# Altium footprint library Elettronica FM.PcbLib: 387 footprints (part 13 of 25)
Each footprint in its own frame and in the unit in brackets; x right, y up, seen from the top. Pads: shape width x height; smd on the part's side, far side on the other; paste and mask are expansions set on the pad; w line width, h text height; cw(c..) or ccw(c..) is an arc to the next point about the centre after c.
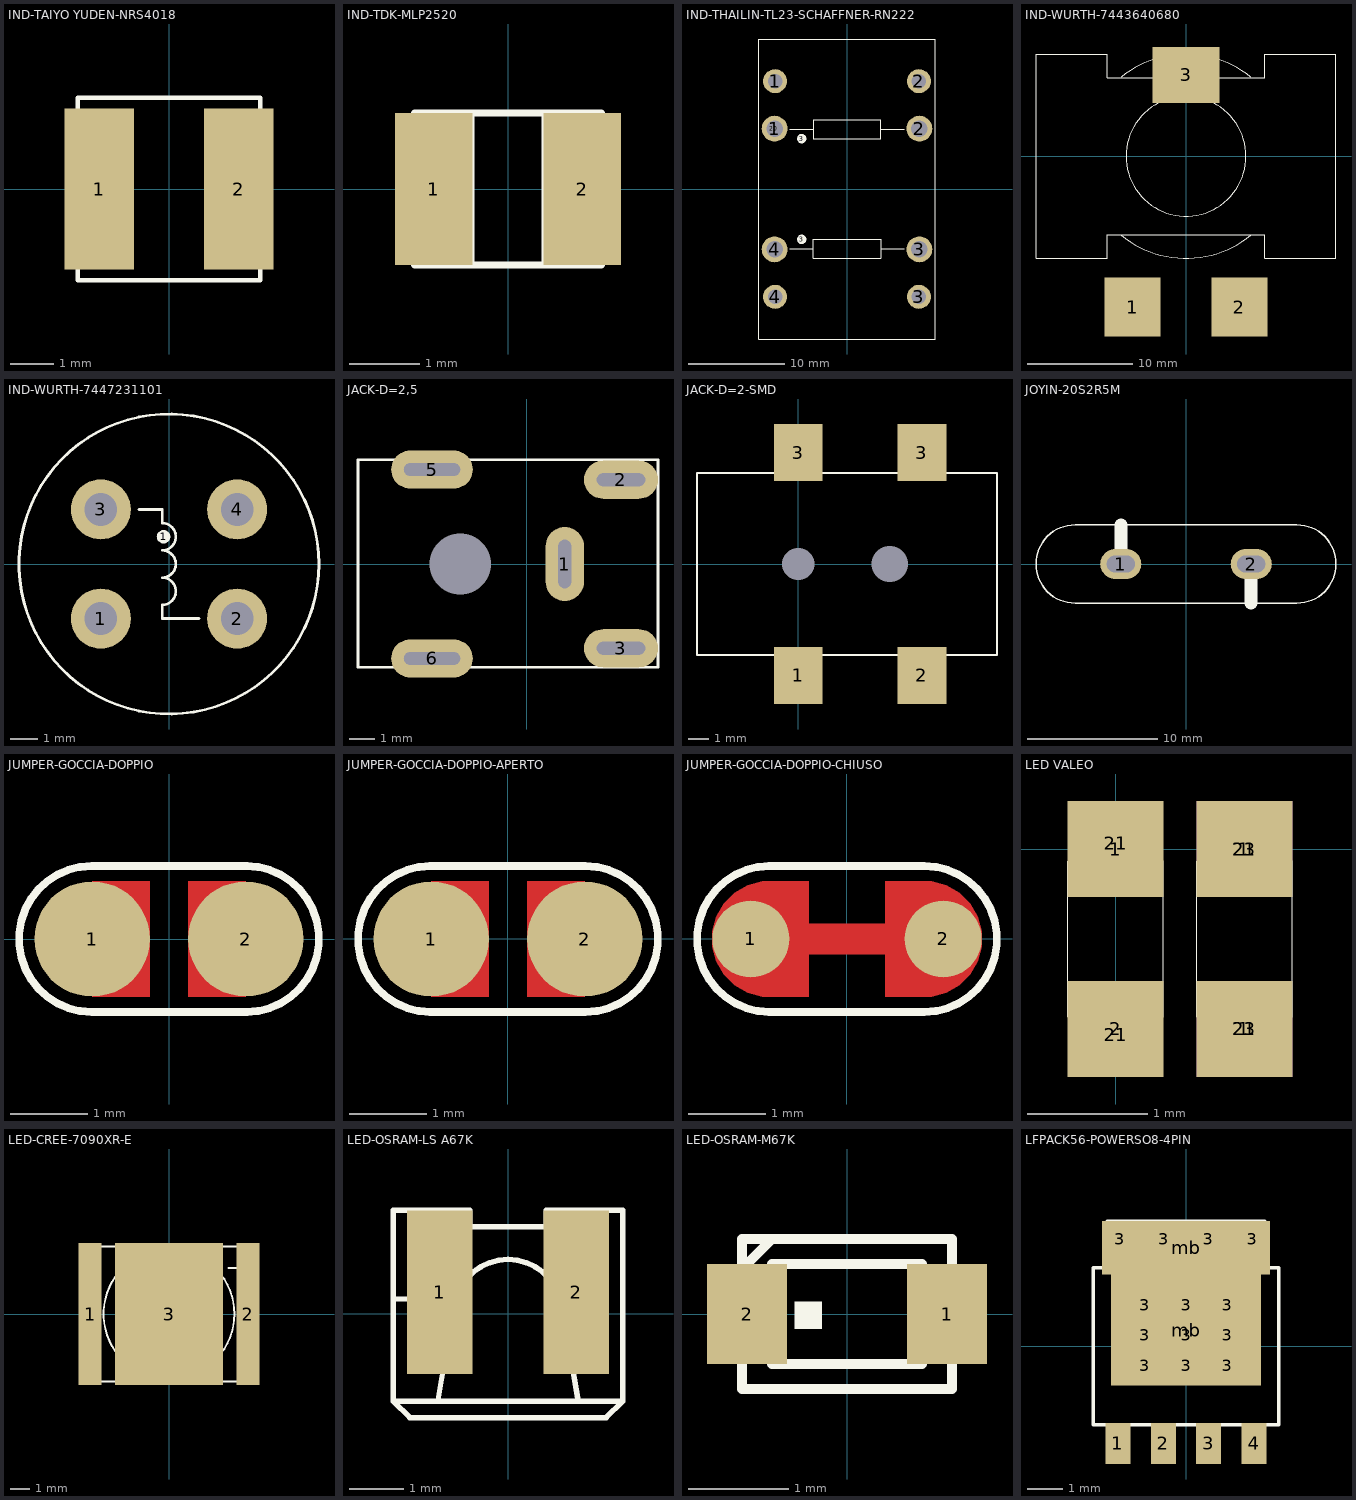
[diagram p12: the footprints below, top view; thin cyan lines are the x and y axes]

## IND-TAIYO YUDEN-NRS4018 [mm]
height 1.9
pads (2):
  rect 1.6x3.7 smd mask+0.075: 1(-1.6,0) 2(1.6,0)
Top Overlay:
  lines w0.1: -2.1,-2.1 -2.1,2.1 2.1,2.1 2.1,-2.1 -2.1,-2.1
3D body: height 1.8, standoff 0, extent -2.1,-2.1 2.1,2.1

## IND-TDK-MLP2520 [mm]
height 12
pads (2):
  rect 1.1x2.15 smd mask+0.1: 1(-1.05,0) 2(1.05,0)
Top Overlay:
  lines w0.1: -0.525,-1.075 -0.525,1.075 ; 0.525,-1.075 0.525,1.075 ; -1.325,-1.075 1.325,-1.075 1.325,1.075 -1.325,1.075 -1.325,-1.075
3D body: height 1.2, standoff 0, extent -1.325,-1.075 1.325,1.075

## IND-THAILIN-TL23-SCHAFFNER-RN222 [mm]
pads (11):
  round 2.7 hole 1.7: 1(-7.55,6.3) 2(7.55,6.3) 3(7.55,-6.3) 4(-7.55,-6.3)
  round 2.5 hole 1.5: 1(-7.5,11.25) 2(7.5,11.25) 3(7.5,-11.25) 4(-7.5,-11.25)
  round 1 on Top Overlay mask+0.1: 3(-4.725,-5.25) 3(-4.725,5.25) 20(-7.62,6.3)
Top Overlay:
  lines w0.1: -5.95,-6.25 -3.5,-6.25 ; -5.95,6.25 -3.5,6.25 ; 3.5,-6.25 5.95,-6.25 ; 3.5,6.25 5.95,6.25 ; -9.2,-15.65 -9.2,15.65 9.2,15.65 9.2,-15.65 -9.2,-15.65 ; -3.5,-7.25 -3.5,-5.25 3.5,-5.25 3.5,-7.25 -3.5,-7.25 ; -3.5,5.25 3.5,5.25 3.5,7.25 -3.5,7.25 -3.5,5.25
3D body: height 29.6, standoff 0, extent -9.2,-15.65 9.2,15.65

## IND-WURTH-7443640680 [mm]
height 1.9
pads (3):
  rect 5.35x5.6 smd: 1(-5.075,-14.325) 2(5.075,-14.325)
  rect 6.35x5.3 smd: 3(0,7.725)
Top Overlay:
  circle w0.1: c0,0 r5.7
  lines w0.1: -6.171,-7.484 ccw(c0,0) 6.171,-7.484 ; -6.171,7.484 cw(c0,0) 6.171,7.484 ; -14.25,-9.7 -14.25,9.7 -7.5,9.7 -7.5,7.475 7.5,7.475 7.5,9.7 14.25,9.7 14.25,-9.7 7.5,-9.7 7.5,-7.475 -7.5,-7.475 -7.5,-9.7 -14.25,-9.7
3D body "STEP-WE-HCF-2818-rev1.stp": height 18.5, standoff 0, extent -14.25,-16.65 14.25,11.35

## IND-WURTH-7447231101 [mm]
pads (5):
  round 2.2 hole 1.2 paste+0 mask+0.05: 1(-2.5,-2) 2(2.5,-2) 3(-2.5,2) 4(2.5,2)
  round 0.5 on Top Overlay paste+0 mask+0.05: 1(-0.2,1)
Top Overlay:
  circle w0.1: c0,0 r5.5
  lines w0.1: -1.1,2 -0.25,2 -0.25,1.5 cw(c-0.25,1) -0.25,0.5 cw(c-0.25,0) -0.25,-0.5 cw(c-0.25,-1) -0.25,-1.5 -0.25,-2 1.1,-2
3D body: height 19, standoff 0, extent -5.5,-5.5 5.5,5.5

## JACK-D=2,5 [mm]
pads (6):
  round 0 hole 2.4 unplated mask+0.1: 1(-2.6,0)
  oval 1.5x2.9 hole 0.5 slot 1.9 at 90 deg mask+0.1: 1(1.5,0)
  oval 2.9x1.5 hole 0.5 slot 1.9 at 0 deg mask+0.1: 2(3.7,3.3) 3(3.7,-3.3)
  oval 3.2x1.5 hole 0.5 slot 2.2 at 0 deg mask+0.1: 5(-3.7,3.7) 6(-3.7,-3.7)
Top Overlay:
  lines w0.1: -6.6,-4.05 -6.6,4.075 5.15,4.075 5.15,-4.05 -6.6,-4.05
3D body "PJ-047BH.stp": height 9.8, standoff -2.7, extent -6.6,-3.85 5.15,3.85

## JACK-D=2-SMD [mm]
pads (6):
  rect 2.4x2.8 smd mask+0.1: 1(0,-5.5) 2(6.1,-5.5) 3(0,5.5) 3(6.1,5.5)
  round 0 hole 1.6 unplated mask+0.1: 1(0,0)
  round 0 hole 1.8 unplated mask+0.1: 1(4.5,0)
Top Overlay:
  lines w0.1: -5,-4.5 -5,4.5 9.8,4.5 9.8,-4.5 -5,-4.5
3D body "PJ-002AH-SMT.stp": height 11, standoff -1.2, extent -5,-6.3 9.8,6.3

## JOYIN-20S2R5M [mm]
pads (2):
  oval 3.15x2.3 hole 1.3 slot 2.15 at 0 deg: 1(-5,0) 2(5,0)
Top Overlay:
  lines w0.1: -8.5,-3 cw(c-8.5,0) -8.5,3 8.5,3 cw(c8.5,0) 8.5,-3 -8.5,-3
  lines w1: -5,0 -5,3 ; 5,-3 5,0
3D body: height 2, standoff 0, extent 4.45,-2.499 5.545,-1.401
3D body: height 7, standoff 2, extent 3.95,-2.998 6.041,-0.902
3D body: height 1.1, standoff 0, extent 4.447,-2.499 5.543,0.501
3D body: height 0, standoff -4, extent 4.45,-0.599 5.545,0.499
3D body: height 0, standoff -4, extent -5.545,-0.499 -4.45,0.599
3D body: height 1.1, standoff 0, extent -5.543,-0.501 -4.447,2.499
3D body: height 7, standoff 2, extent -6.041,0.902 -3.95,2.998
3D body: height 2, standoff 0, extent -5.545,1.401 -4.45,2.499
3D body: height 28, standoff 5, extent -11.5,-3 11.5,3

## JUMPER-GOCCIA-DOPPIO [mm]
pads (2):
  round 1.5 smd paste-0.762: 1(-1,0) 2(1,0)
Top Layer:
  region: 1,0.75 0.25,0.75 0.25,-0.75 1,-0.75
  region: 1,0.75 0.25,0.75 0.25,-0.75 1,-0.75
  region: -1,0.75 -0.25,0.75 -0.25,-0.75 -1,-0.75
Top Overlay:
  lines w0.1: 1,-0.95 ccw(c1,0) 1,0.95 ; 1.016,-0.95 -1,-0.95 cw(c-1,0) -1,0.95 1.016,0.95
Top Solder:
  region: 1,0.85 0.15,0.85 0.15,-0.85 1,-0.85
  region: -1,0.85 -0.15,0.85 -0.15,-0.85 -1,-0.85

## JUMPER-GOCCIA-DOPPIO-APERTO [mm]
height 1.9
pads (2):
  round 1.5 smd paste-0.762: 1(-1,0) 2(1,0)
Top Layer:
  region: -1,-0.75 -0.25,-0.75 -0.25,0.75 -1,0.75
  region: -1,-0.75 -0.25,-0.75 -0.25,0.75 -1,0.75
  region: 1,-0.75 0.25,-0.75 0.25,0.75 1,0.75
Top Overlay:
  lines w0.1: -1.016,-0.95 1,-0.95 ccw(c1,0) 1,0.95 -1.016,0.95 ; -1,-0.95 cw(c-1,0) -1,0.95
Top Solder:
  region: -1,-0.85 -0.15,-0.85 -0.15,0.85 -1,0.85
  region: 1,-0.85 0.15,-0.85 0.15,0.85 1,0.85

## JUMPER-GOCCIA-DOPPIO-CHIUSO [mm]
height 1.9
pads (2):
  round 1 smd paste-0.762: 1(-1.25,0) 2(1.25,0)
Top Layer:
  region: -0.8,0.2 -0.8,-0.2 0.8,-0.2 0.8,0.2
  region: -0.5,0.75 -1,0.75 -1.099,0.75 -1.289,0.699 -1.461,0.6 -1.6,0.461 -1.699,0.289 -1.75,0.099 -1.75,-0.099 -1.699,-0.289 -1.6,-0.461 -1.461,-0.6 -1.289,-0.699 -1.099,-0.75 -1,-0.75 -0.5,-0.75
  region: 0.5,0.75 1,0.75 1.099,0.75 1.289,0.699 1.461,0.6 1.6,0.461 1.699,0.289 1.75,0.099 1.75,-0.099 1.699,-0.289 1.6,-0.461 1.461,-0.6 1.289,-0.699 1.099,-0.75 1,-0.75 0.5,-0.75
Top Overlay:
  lines w0.1: -1.016,-0.95 1,-0.95 ccw(c1,0) 1,0.95 -1.016,0.95 ; -1,-0.95 cw(c-1,0) -1,0.95
Top Solder:
  region: 1,0.85 -1,0.85 -1.112,0.85 -1.328,0.792 -1.522,0.68 -1.68,0.522 -1.792,0.328 -1.85,0.112 -1.85,-0.112 -1.792,-0.328 -1.68,-0.522 -1.522,-0.68 -1.328,-0.792 -1.112,-0.85 -1,-0.85 1,-0.85 1.112,-0.85 1.328,-0.792 1.522,-0.68 1.68,-0.522 1.792,-0.328 1.85,-0.112 1.85,0.112 1.792,0.328 1.68,0.522 1.522,0.68 1.328,0.792 1.112,0.85

## LED VALEO [mm]
pads (10):
  rect 0.8x0.8 smd paste+0 mask-50: 1(0,0) 1(1.075,-1.5) 1(1.075,0) 2(0,-1.5)
  rect 0.7x0.6 on Top Solder paste+0 mask+0.05: 21(0,-1.55) 21(0,0.05)
  rect 1x1 on Top Solder paste+0 mask+0.05: 21(1.075,-1.5) 21(1.075,0)
  rect 0.8x0.8 on Mech9 paste+0 mask+0.05: 23(1.075,-1.5) 23(1.075,0)
Top Overlay:
  lines w0.01: -0.35,-1.4 -0.35,-1.6 0.35,-1.6 0.35,-1.4 ; -0.35,-0.1 -0.35,0.1 0.35,0.1 0.35,-0.1 ; 0.725,-1.4 0.725,-1.6 1.425,-1.6 1.425,-1.4 ; 0.725,-0.1 0.725,0.1 1.425,0.1 1.425,-0.1 ; -0.4,-1.4 -0.4,-0.1 0.4,-0.1 0.4,-1.4 -0.4,-1.4 ; 0.675,-1.4 1.475,-1.4 1.475,-0.1 0.675,-0.1 0.675,-1.4

## LED-CREE-7090XR-E [mm]
height 8.5
pads (3):
  rect 1.2x7.4 smd: 1(-4.1,0) 2(4.1,0)
  rect 5.6x7.4 smd: 3(0,0)
Top Overlay:
  circle w0.1: c0,0 r3.4
  lines w0.1: 3.1,2.4 4.1,2.4 ; 3.6,1.9 3.6,2.9 ; -4.5,-3.5 4.5,-3.5 4.5,3.5 -4.5,3.5 -4.5,-3.5

## LED-OSRAM-LS A67K [mm]
height 16.6
pads (2):
  rect 1.2x3 smd: 1(-1.25,0.4) 2(1.25,0.4)
Top Overlay:
  lines w0.1: -2.1,0.275 -1.1,0.275 ccw(c-1.1,0.475) -0.9,0.475 -0.9,1.9 ; -1.284,-1.578 -0.981,0.196 cw(c0,0) 0.981,0.196 1.287,-1.598 ; -2.1,-1.6 2.1,-1.6 ; -2.1,-1.6 -2.1,1.9 -0.7,1.9 -0.7,1.6 0.7,1.6 0.7,1.9 2.1,1.9 2.1,-1.6 ; -2.1,-1.6 -1.8,-1.9 1.8,-1.9 2.1,-1.6
  text "K" at -1.7,0.825 h0.6
  text "A" at 1.3,0.825 h0.6
3D body "LS_A67K_20150807_geometry.STEP": height 4.25, standoff 0.22, extent -2,-1.915 2,1.85

## LED-OSRAM-M67K [mm]
height 16.6
pads (2):
  rect 0.8x1 smd paste-0.05: 1(1,0) 2(-1,0)
Top Overlay:
  rectangle: -0.525,-0.15 -0.25,0.125
  lines w0.1: -1.05,0.45 -0.75,0.75 -0.5,0.75 ; -1.05,-0.75 1.05,-0.75 1.05,0.75 -1.05,0.75 -1.05,-0.75 ; -0.75,-0.5 0.75,-0.5 0.75,0.5 -0.75,0.5 -0.75,-0.5

## LFPACK56-POWERSO8-4PIN [mm]
height 1.9
pads (19):
  rect 0.7x1.15 smd paste-0.05 mask+0.075: 1(-1.905,-2.725) 2(-0.635,-2.725) 3(0.635,-2.725) 4(1.905,-2.725)
  rect 0.6x0.9 on Top Paste mask+0.1: 3(-1.85,3) 3(-0.625,3) 3(0.625,3) 3(1.85,3)
  rect 0.9x0.6 on Top Paste mask+0.1: 3(-1.15,-0.55) 3(-1.15,0.3) 3(-1.15,1.15) 3(0,-0.55) 3(0,0.3) 3(0,1.15) 3(1.15,-0.55) 3(1.15,0.3) 3(1.15,1.15)
  rect 4.2x3.1 smd paste-50 mask+0.075: mb(0,0.45)
  rect 4.7x1.5 smd paste-50 mask+0.075: mb(0,2.75)
Top Overlay:
  lines w0.1: -2.2,2.2 -2.2,3.5 2.2,3.5 2.2,2.2 ; -2.6,-2.2 -2.6,2.2 2.6,2.2 2.6,-2.2 -2.6,-2.2
3D body: height 0.3, standoff 0, extent -2.2,2.2 2.2,3.5
3D body: height 1.1, standoff 0, extent -2.6,-2.2 2.6,2.2